# Altium footprint library Package_DIP.PcbLib: 236 footprints (part 2 of 15)
Each footprint in its own frame and in the unit in brackets; x right, y up, seen from the top. Pads: shape width x height; smd on the part's side, far side on the other; paste and mask are expansions set on the pad; w line width, h text height; cw(c..) or ccw(c..) is an arc to the next point about the centre after c.
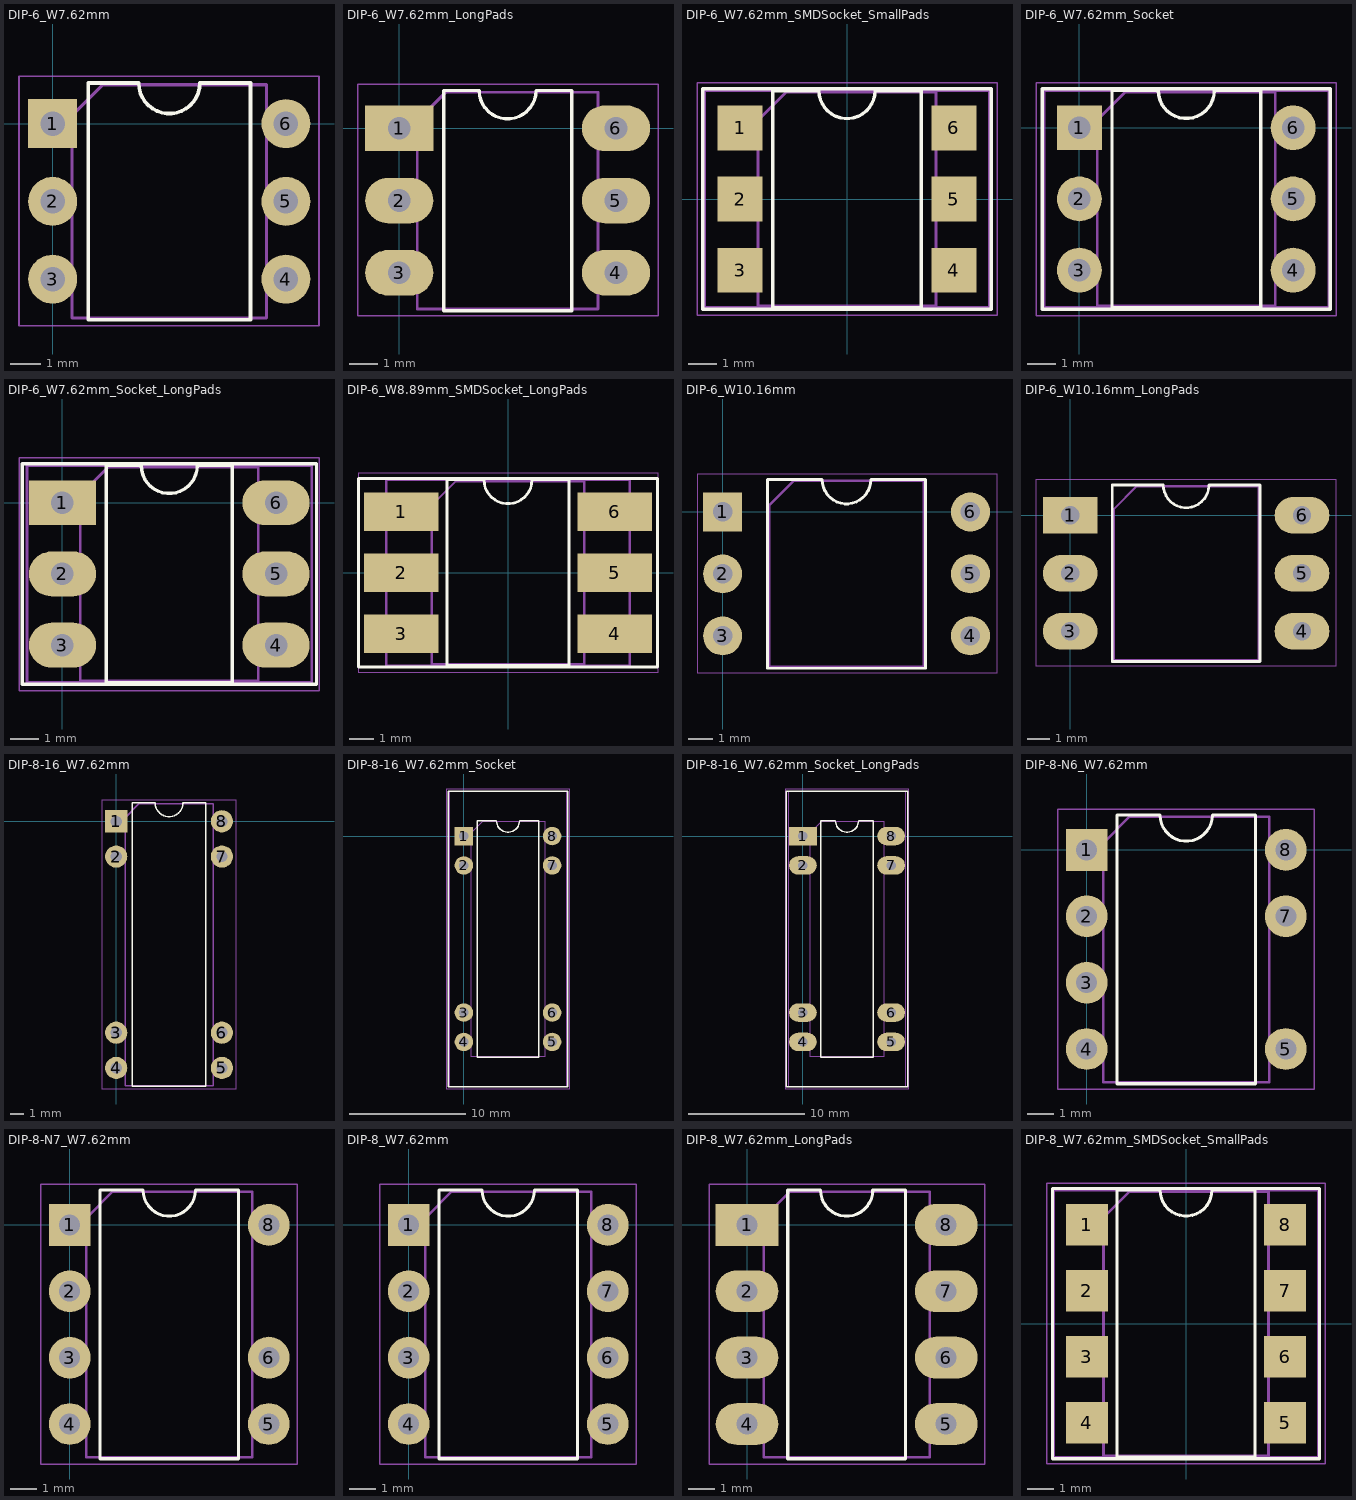
[diagram p1: the footprints below, top view; thin cyan lines are the x and y axes]

## DIP-6_W7.62mm [mm]
pads (6):
  rect 1.6x1.6 hole 0.8: 1(0,0)
  rrect100% 1.6x1.6 hole 0.8: 2(0,-2.54) 3(0,-5.08) 4(7.62,-5.08) 5(7.62,-2.54) 6(7.62,0)
F.SilkS:
  lines w0.12: 1.16,-6.41 1.16,1.33 2.81,1.33 ccw(c3.81,1.33) 4.81,1.33 6.46,1.33 6.46,-6.41 1.16,-6.41
F.CrtYd:
  lines w0.05: -1.1,-6.6 8.7,-6.6 8.7,1.55 -1.1,1.55 -1.1,-6.6
F.Fab:
  lines w0.1: 0.635,-6.35 6.985,-6.35 6.985,1.27 1.635,1.27 0.635,0.27 0.635,-6.35
  text "'.Designator'" at -0.237,-3.38 h1

## DIP-6_W7.62mm_LongPads [mm]
pads (6):
  rect 2.4x1.6 hole 0.8: 1(0,0)
  rrect100% 2.4x1.6 hole 0.8: 2(0,-2.54) 3(0,-5.08) 4(7.62,-5.08) 5(7.62,-2.54) 6(7.62,0)
F.SilkS:
  lines w0.12: 1.56,-6.41 6.06,-6.41 6.06,1.33 4.81,1.33 cw(c3.81,1.33) 2.81,1.33 1.56,1.33 1.56,-6.41
F.CrtYd:
  lines w0.05: -1.45,-6.6 -1.45,1.55 9.1,1.55 9.1,-6.6 -1.45,-6.6
F.Fab:
  lines w0.1: 0.635,-6.35 0.635,0.27 1.635,1.27 6.985,1.27 6.985,-6.35 0.635,-6.35
  text "'.Designator'" at -0.237,-3.38 h1

## DIP-6_W7.62mm_SMDSocket_SmallPads [mm]
pads (6):
  rect 1.6x1.6 smd: 1(-3.81,2.54) 2(-3.81,0) 3(-3.81,-2.54) 4(3.81,-2.54) 5(3.81,0) 6(3.81,2.54)
F.SilkS:
  lines w0.12: -5.14,-3.93 -5.14,3.93 5.14,3.93 5.14,-3.93 -5.14,-3.93 ; -2.65,-3.87 -2.65,3.87 -1,3.87 ccw(c0,3.87) 1,3.87 2.65,3.87 2.65,-3.87 -2.65,-3.87
F.CrtYd:
  lines w0.05: -5.35,-4.15 -5.35,4.15 5.35,4.15 5.35,-4.15 -5.35,-4.15
F.Fab:
  lines w0.1: -5.08,-3.87 -5.08,3.87 5.08,3.87 5.08,-3.87 -5.08,-3.87 ; -3.175,-3.81 3.175,-3.81 3.175,3.81 -2.175,3.81 -3.175,2.81 -3.175,-3.81
  text "'.Designator'" at -4.047,-0.84 h1

## DIP-6_W7.62mm_Socket [mm]
pads (6):
  rect 1.6x1.6 hole 0.8: 1(0,0)
  rrect100% 1.6x1.6 hole 0.8: 2(0,-2.54) 3(0,-5.08) 4(7.62,-5.08) 5(7.62,-2.54) 6(7.62,0)
F.SilkS:
  lines w0.12: -1.33,-6.47 -1.33,1.39 8.95,1.39 8.95,-6.47 -1.33,-6.47 ; 1.16,-6.41 1.16,1.33 2.81,1.33 ccw(c3.81,1.33) 4.81,1.33 6.46,1.33 6.46,-6.41 1.16,-6.41
F.CrtYd:
  lines w0.05: -1.55,-6.7 -1.55,1.6 9.15,1.6 9.15,-6.7 -1.55,-6.7
F.Fab:
  lines w0.1: -1.27,-6.41 -1.27,1.33 8.89,1.33 8.89,-6.41 -1.27,-6.41 ; 0.635,-6.35 6.985,-6.35 6.985,1.27 1.635,1.27 0.635,0.27 0.635,-6.35
  text "'.Designator'" at -0.237,-3.38 h1

## DIP-6_W7.62mm_Socket_LongPads [mm]
pads (6):
  rect 2.4x1.6 hole 0.8: 1(0,0)
  rrect100% 2.4x1.6 hole 0.8: 2(0,-2.54) 3(0,-5.08) 4(7.62,-5.08) 5(7.62,-2.54) 6(7.62,0)
F.SilkS:
  lines w0.12: -1.44,-6.47 9.06,-6.47 9.06,1.39 -1.44,1.39 -1.44,-6.47 ; 1.56,-6.41 6.06,-6.41 6.06,1.33 4.81,1.33 cw(c3.81,1.33) 2.81,1.33 1.56,1.33 1.56,-6.41
F.CrtYd:
  lines w0.05: -1.55,-6.7 9.15,-6.7 9.15,1.6 -1.55,1.6 -1.55,-6.7
F.Fab:
  lines w0.1: -1.27,-6.41 8.89,-6.41 8.89,1.33 -1.27,1.33 -1.27,-6.41 ; 0.635,-6.35 6.985,-6.35 6.985,1.27 1.635,1.27 0.635,0.27 0.635,-6.35
  text "'.Designator'" at -0.237,-3.38 h1

## DIP-6_W8.89mm_SMDSocket_LongPads [mm]
pads (6):
  rect 3.1x1.6 smd: 1(-4.445,2.54) 2(-4.445,0) 3(-4.445,-2.54) 4(4.445,-2.54) 5(4.445,0) 6(4.445,2.54)
F.SilkS:
  lines w0.12: -6.235,-3.93 6.235,-3.93 6.235,3.93 -6.235,3.93 -6.235,-3.93 ; -2.535,-3.87 -2.535,3.87 -1,3.87 ccw(c0,3.87) 1,3.87 2.535,3.87 2.535,-3.87 -2.535,-3.87
F.CrtYd:
  lines w0.05: -6.25,-4.15 -6.25,4.15 6.25,4.15 6.25,-4.15 -6.25,-4.15
F.Fab:
  lines w0.1: -5.08,-3.87 5.08,-3.87 5.08,3.87 -5.08,3.87 -5.08,-3.87 ; -3.175,-3.81 -3.175,2.81 -2.175,3.81 3.175,3.81 3.175,-3.81 -3.175,-3.81
  text "'.Designator'" at -4.047,-0.84 h1

## DIP-6_W10.16mm [mm]
pads (6):
  rect 1.6x1.6 hole 0.8: 1(0,0)
  rrect100% 1.6x1.6 hole 0.8: 2(0,-2.54) 3(0,-5.08) 4(10.16,-5.08) 5(10.16,-2.54) 6(10.16,0)
F.SilkS:
  lines w0.12: 1.845,-6.41 1.845,1.33 4.08,1.33 ccw(c5.08,1.33) 6.08,1.33 8.315,1.33 8.315,-6.41 1.845,-6.41
F.CrtYd:
  lines w0.05: -1.05,-6.6 11.25,-6.6 11.25,1.55 -1.05,1.55 -1.05,-6.6
F.Fab:
  lines w0.1: 1.905,-6.35 1.905,0.27 2.905,1.27 8.255,1.27 8.255,-6.35 1.905,-6.35
  text "'.Designator'" at 1.033,-3.38 h1

## DIP-6_W10.16mm_LongPads [mm]
pads (6):
  rect 2.4x1.6 hole 0.8: 1(0,0)
  rrect100% 2.4x1.6 hole 0.8: 2(0,-2.54) 3(0,-5.08) 4(10.16,-5.08) 5(10.16,-2.54) 6(10.16,0)
F.SilkS:
  lines w0.12: 1.845,-6.41 8.315,-6.41 8.315,1.33 6.08,1.33 cw(c5.08,1.33) 4.08,1.33 1.845,1.33 1.845,-6.41
F.CrtYd:
  lines w0.05: -1.5,-6.6 11.65,-6.6 11.65,1.55 -1.5,1.55 -1.5,-6.6
F.Fab:
  lines w0.1: 1.905,-6.35 1.905,0.27 2.905,1.27 8.255,1.27 8.255,-6.35 1.905,-6.35
  text "'.Designator'" at 1.033,-3.38 h1

## DIP-8-16_W7.62mm [mm]
pads (8):
  rect 1.6x1.6 hole 0.8: 1(0,0)
  round 1.6 hole 0.8: 2(0,-2.54) 3(0,-15.24) 4(0,-17.78) 5(7.62,-17.78) 6(7.62,-15.24) 7(7.62,-2.54) 8(7.62,0)
F.SilkS:
  lines w0.12: 1.16,-19.11 6.46,-19.11 6.46,1.33 4.81,1.33 cw(c3.81,1.33) 2.81,1.33 1.16,1.33 1.16,-19.11
F.CrtYd:
  lines w0.05: -1.06,-19.3 -1.06,1.52 8.67,1.52 8.67,-19.3 -1.06,-19.3
F.Fab:
  lines w0.1: 0.635,-19.05 6.985,-19.05 6.985,1.27 1.635,1.27 0.635,0.27 0.635,-19.05
  text "'.Designator'" at -0.237,-9.73 h1

## DIP-8-16_W7.62mm_Socket [mm]
pads (8):
  rect 1.6x1.6 hole 0.8: 1(0,0)
  round 1.6 hole 0.8: 2(0,-2.54) 3(0,-15.24) 4(0,-17.78) 5(7.62,-17.78) 6(7.62,-15.24) 7(7.62,-2.54) 8(7.62,0)
F.SilkS:
  lines w0.12: -1.33,-21.65 -1.33,3.87 8.95,3.87 8.95,-21.65 -1.33,-21.65 ; 1.16,-19.11 6.46,-19.11 6.46,1.33 4.81,1.33 cw(c3.81,1.33) 2.81,1.33 1.16,1.33 1.16,-19.11
F.CrtYd:
  lines w0.05: -1.52,-21.84 9.14,-21.84 9.14,4.06 -1.52,4.06 -1.52,-21.84
F.Fab:
  lines w0.1: -1.27,-21.59 -1.27,3.81 8.89,3.81 8.89,-21.59 -1.27,-21.59 ; 0.635,-19.05 6.985,-19.05 6.985,1.27 1.635,1.27 0.635,0.27 0.635,-19.05
  text "'.Designator'" at -0.237,-9.73 h1

## DIP-8-16_W7.62mm_Socket_LongPads [mm]
pads (8):
  rect 2.4x1.6 hole 0.8: 1(0,0)
  rrect100% 2.4x1.6 hole 0.8: 2(0,-2.54) 3(0,-15.24) 4(0,-17.78) 5(7.62,-17.78) 6(7.62,-15.24) 7(7.62,-2.54) 8(7.62,0)
F.SilkS:
  lines w0.12: -1.44,-21.65 -1.44,3.87 9.06,3.87 9.06,-21.65 -1.44,-21.65 ; 1.56,-19.11 6.06,-19.11 6.06,1.33 4.81,1.33 cw(c3.81,1.33) 2.81,1.33 1.56,1.33 1.56,-19.11
F.CrtYd:
  lines w0.05: -1.52,-21.84 -1.52,4.06 9.14,4.06 9.14,-21.84 -1.52,-21.84
F.Fab:
  lines w0.1: -1.27,-21.59 -1.27,3.81 8.89,3.81 8.89,-21.59 -1.27,-21.59 ; 0.635,-19.05 0.635,0.27 1.635,1.27 6.985,1.27 6.985,-19.05 0.635,-19.05
  text "'.Designator'" at -0.237,-9.73 h1

## DIP-8-N6_W7.62mm [mm]
pads (7):
  rect 1.6x1.6 hole 0.8: 1(0,0)
  rrect100% 1.6x1.6 hole 0.8: 2(0,-2.54) 3(0,-5.08) 4(0,-7.62) 5(7.62,-7.62) 7(7.62,-2.54) 8(7.62,0)
F.SilkS:
  lines w0.12: 1.16,-8.95 1.16,1.33 2.81,1.33 ccw(c3.81,1.33) 4.81,1.33 6.46,1.33 6.46,-8.95 1.16,-8.95
F.CrtYd:
  lines w0.05: -1.1,-9.15 8.7,-9.15 8.7,1.55 -1.1,1.55 -1.1,-9.15
F.Fab:
  lines w0.1: 0.635,-8.89 0.635,0.27 1.635,1.27 6.985,1.27 6.985,-8.89 0.635,-8.89
  text "'.Designator'" at -0.237,-4.65 h1

## DIP-8-N7_W7.62mm [mm]
pads (7):
  rect 1.6x1.6 hole 0.8: 1(0,0)
  rrect100% 1.6x1.6 hole 0.8: 2(0,-2.54) 3(0,-5.08) 4(0,-7.62) 5(7.62,-7.62) 6(7.62,-5.08) 8(7.62,0)
F.SilkS:
  lines w0.12: 1.16,-8.95 6.46,-8.95 6.46,1.33 4.81,1.33 cw(c3.81,1.33) 2.81,1.33 1.16,1.33 1.16,-8.95
F.CrtYd:
  lines w0.05: -1.1,-9.15 -1.1,1.55 8.7,1.55 8.7,-9.15 -1.1,-9.15
F.Fab:
  lines w0.1: 0.635,-8.89 6.985,-8.89 6.985,1.27 1.635,1.27 0.635,0.27 0.635,-8.89
  text "'.Designator'" at -0.237,-4.65 h1

## DIP-8_W7.62mm [mm]
pads (8):
  rect 1.6x1.6 hole 0.8: 1(0,0)
  rrect100% 1.6x1.6 hole 0.8: 2(0,-2.54) 3(0,-5.08) 4(0,-7.62) 5(7.62,-7.62) 6(7.62,-5.08) 7(7.62,-2.54) 8(7.62,0)
F.SilkS:
  lines w0.12: 1.16,-8.95 1.16,1.33 2.81,1.33 ccw(c3.81,1.33) 4.81,1.33 6.46,1.33 6.46,-8.95 1.16,-8.95
F.CrtYd:
  lines w0.05: -1.1,-9.15 -1.1,1.55 8.7,1.55 8.7,-9.15 -1.1,-9.15
F.Fab:
  lines w0.1: 0.635,-8.89 6.985,-8.89 6.985,1.27 1.635,1.27 0.635,0.27 0.635,-8.89
  text "'.Designator'" at -0.237,-4.65 h1

## DIP-8_W7.62mm_LongPads [mm]
pads (8):
  rect 2.4x1.6 hole 0.8: 1(0,0)
  rrect100% 2.4x1.6 hole 0.8: 2(0,-2.54) 3(0,-5.08) 4(0,-7.62) 5(7.62,-7.62) 6(7.62,-5.08) 7(7.62,-2.54) 8(7.62,0)
F.SilkS:
  lines w0.12: 1.56,-8.95 1.56,1.33 2.81,1.33 ccw(c3.81,1.33) 4.81,1.33 6.06,1.33 6.06,-8.95 1.56,-8.95
F.CrtYd:
  lines w0.05: -1.45,-9.15 9.1,-9.15 9.1,1.55 -1.45,1.55 -1.45,-9.15
F.Fab:
  lines w0.1: 0.635,-8.89 6.985,-8.89 6.985,1.27 1.635,1.27 0.635,0.27 0.635,-8.89
  text "'.Designator'" at -0.237,-4.65 h1

## DIP-8_W7.62mm_SMDSocket_SmallPads [mm]
pads (8):
  rect 1.6x1.6 smd: 1(-3.81,3.81) 2(-3.81,1.27) 3(-3.81,-1.27) 4(-3.81,-3.81) 5(3.81,-3.81) 6(3.81,-1.27) 7(3.81,1.27) 8(3.81,3.81)
F.SilkS:
  lines w0.12: -5.14,-5.2 5.14,-5.2 5.14,5.2 -5.14,5.2 -5.14,-5.2 ; -2.65,-5.14 -2.65,5.14 -1,5.14 ccw(c0,5.14) 1,5.14 2.65,5.14 2.65,-5.14 -2.65,-5.14
F.CrtYd:
  lines w0.05: -5.35,-5.4 5.35,-5.4 5.35,5.4 -5.35,5.4 -5.35,-5.4
F.Fab:
  lines w0.1: -5.08,-5.14 5.08,-5.14 5.08,5.14 -5.08,5.14 -5.08,-5.14 ; -3.175,-5.08 -3.175,4.08 -2.175,5.08 3.175,5.08 3.175,-5.08 -3.175,-5.08
  text "'.Designator'" at -4.047,-0.84 h1